# Altium footprint library UWRT Footprint Library.PcbLib: 258 footprints (part 12 of 17)
Each footprint in its own frame and in the unit in brackets; x right, y up, seen from the top. Pads: shape width x height; smd on the part's side, far side on the other; paste and mask are expansions set on the pad; w line width, h text height; cw(c..) or ccw(c..) is an arc to the next point about the centre after c.
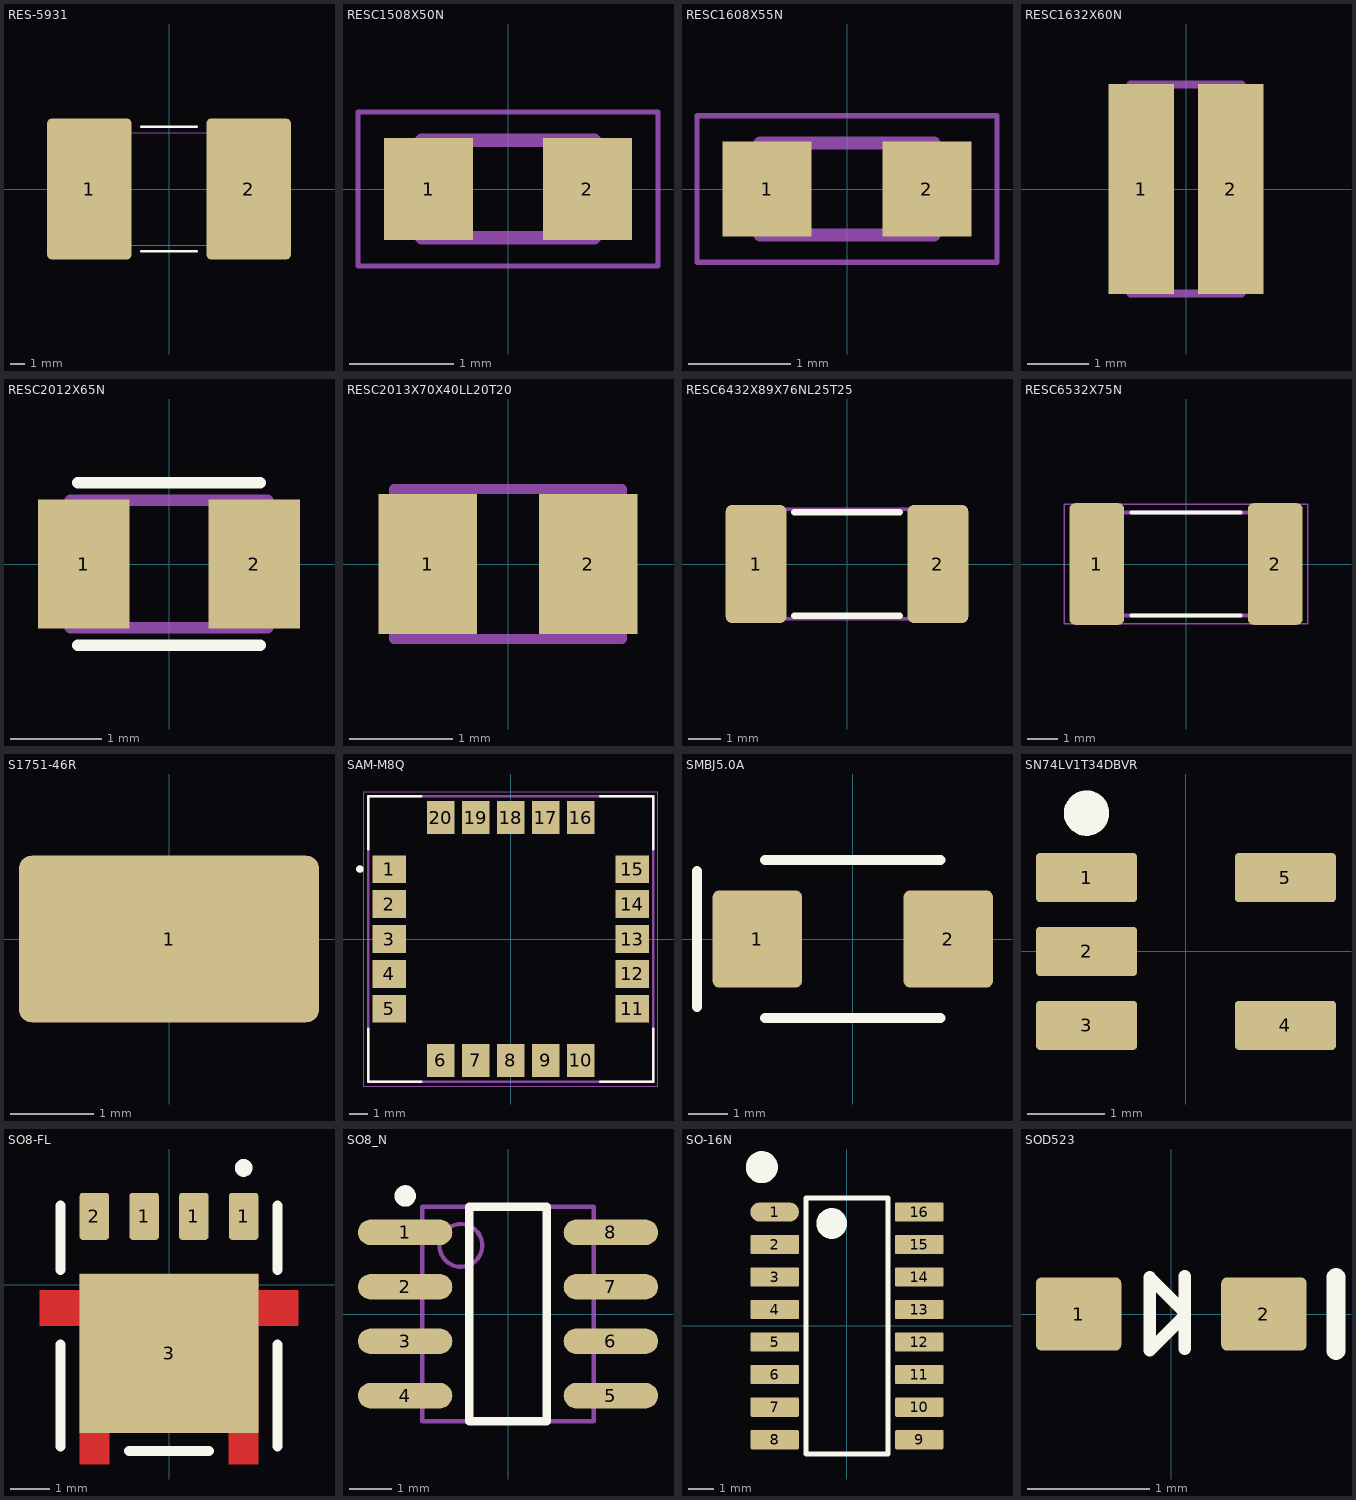
[diagram p11: the footprints below, top view; thin cyan lines are the x and y axes]

## RES-5931 [mm]
pads (2):
  rrect10% 6x10 smd paste+0 mask+0: 1(-5.664,0) 2(5.664,0)
Top Overlay:
  lines w0.152: -2,-4.427 2,-4.427 ; -2,4.427 2,4.427
Mechanical 13:
  circle w0: c-5.537,0 r0.076
  lines w0.025: -7.633,-4 -7.633,4 ; -7.633,-4 7.633,-4 ; -7.633,-4 -3.391,-4 -3.391,4 -7.633,4 ; -7.633,-4 -7.633,4 ; -7.633,4 7.633,4 ; 7.633,-4 7.633,4 ; 7.633,-4 7.633,4 ; 7.633,-4 3.391,-4 3.391,4 7.633,4
3D body "User Library-WSSL5931.step": height 2.36, standoff 0.01, extent -7.5,-3.875 7.5,3.875

## RESC1508X50N [mm]
pads (2):
  rect 0.86x0.98 smd: 1(-0.765,0) 2(0.765,0)
Mechanical 13:
  lines w0.127: -0.83,-0.47 -0.83,0.47 0.83,0.47 0.83,-0.47 -0.83,-0.47
Mechanical 15:
  lines w0.05: -1.444,-0.74 -1.444,0.74 1.444,0.74 1.444,-0.74 -1.444,-0.74

## RESC1608X55N [mm]
pads (2):
  rect 0.87x0.93 smd: 1(-0.78,0) 2(0.78,0)
Mechanical 13:
  lines w0.127: -0.85,-0.45 0.85,-0.45 0.85,0.45 -0.85,0.45 -0.85,-0.45
Mechanical 15:
  lines w0.05: -1.465,-0.715 1.465,-0.715 1.465,0.715 -1.465,0.715 -1.465,-0.715

## RESC1632X60N [mm]
pads (2):
  rect 1.06x3.42 smd: 1(-0.728,0) 2(0.728,0)
Mechanical 13:
  lines w0.127: -0.9,-1.7 0.9,-1.7 0.9,1.7 -0.9,1.7 -0.9,-1.7
3D body "PRL1632-R016-F-T1.STEP": height 0.6, standoff 0, extent -0.798,-1.619 0.802,1.581

## RESC2012X65N [mm]
pads (2):
  rect 1x1.42 smd: 1(-0.935,0) 2(0.935,0)
Top Overlay:
  lines w0.127: -1,-0.89 1,-0.89 ; -1,0.89 1,0.89
Mechanical 4:
  lines w0.127: -1.08,-0.7 1.08,-0.7 ; -1.08,-0.7 -1.08,0.7 ; -1.08,-0.7 1.08,-0.7 ; -1.08,-0.7 -1.08,0.7 ; -1.08,0.7 1.08,0.7 ; -1.08,0.7 1.08,0.7 ; 1.08,-0.7 1.08,0.7 ; 1.08,-0.7 1.08,0.7
3D body "1-1614959-4--3DModel-STEP-56544.STEP": height 0.6, standoff 0, extent -1,-0.625 1,0.625

## RESC2013X70X40LL20T20 [mm] "Chip Resistor, 2-Leads, Body 2.00x1.25mm, IPC High Density"
height 0.7
pads (2):
  rect 0.95x1.35 smd: 1(-0.775,0) 2(0.775,0)
Mechanical 13:
  lines w0.1: -1.1,-0.725 1.1,-0.725 1.1,0.725 -1.1,0.725 -1.1,-0.725
3D body: height 0.7, standoff 0, extent 0.7,-0.725 1.1,0.725
3D body: height 0.7, standoff 0, extent -1.1,-0.725 -0.7,0.725
3D body: height 0.7, standoff 0, extent -0.7,-0.725 0.7,0.725

## RESC6432X89X76NL25T25 [mm] "Chip Resistor, 2-Leads, Body 6.6x3.43mm, IPC Medium Density"
height 0.89
pads (2):
  rrect20% 1.9x3.7 smd: 1(-2.85,0) 2(2.85,0)
Top Overlay:
  lines w0.2: -1.65,-1.625 1.65,-1.625 ; -1.65,1.625 1.65,1.625
Mechanical 13:
  lines w0.1: -3.3,-1.715 -3.3,1.715 3.3,1.715 3.3,-1.715 -3.3,-1.715
3D body "DIOC6432X09N.step": height 0.89, standoff 0, extent -3.3,-1.715 3.3,1.715

## RESC6532X75N [mm]
pads (2):
  rrect20% 1.8x4 smd: 1(-2.935,0) 2(2.935,0)
Top Overlay:
  lines w0.127: -1.79,-1.7 1.79,-1.7 ; -1.79,1.7 1.79,1.7
Mechanical 4:
  lines w0.127: -3.4,-1.7 -3.4,1.7 ; -3.4,-1.7 3.4,-1.7 ; -3.4,-1.7 -3.4,1.7 ; -3.4,-1.7 3.4,-1.7 ; -3.4,1.7 3.4,1.7 ; -3.4,1.7 3.4,1.7 ; 3.4,-1.7 3.4,1.7 ; 3.4,-1.7 3.4,1.7
Mechanical 16:
  lines w0.05: -4.005,-1.958 -4.005,1.958 4.005,1.958 4.005,-1.958 -4.005,-1.958
3D body "2512 Model.STEP": height 0.65, standoff 0, extent -3.175,-1.6 3.175,1.6

## S1751-46R [mm] "SMD LOOP TESTPOINT"
height 2
pads (1):
  rrect15% 3.6x2 smd: 1(0,0)
3D body "s1751-46r.stp": height 2.01, standoff -0.04, extent -1.625,-0.85 1.625,0.8

## SAM-M8Q [mm]
pads (20):
  rect 1.8x1.5 smd paste-2: 1(-6.6,3.8) 2(-6.6,1.9) 3(-6.6,0) 4(-6.6,-1.9) 5(-6.6,-3.8) 11(6.6,-3.8) 12(6.6,-1.9) 13(6.6,0) 14(6.6,1.9) 15(6.6,3.8)
  rect 1.5x1.8 smd paste-2: 6(-3.8,-6.6) 7(-1.9,-6.6) 8(0,-6.6) 9(1.9,-6.6) 10(3.8,-6.6) 16(3.8,6.6) 17(1.9,6.6) 18(0,6.6) 19(-1.9,6.6) 20(-3.8,6.6)
Top Overlay:
  circle w0.2: c-8.2,3.8 r0.1
  lines w0.127: -7.75,-4.87 -7.75,-7.75 -4.87,-7.75 ; -7.75,4.87 -7.75,7.75 -4.87,7.75 ; 4.87,-7.75 7.75,-7.75 7.75,-4.87 ; 4.87,7.75 7.75,7.75 7.75,4.87
Top Paste:
  drawing of 80 lines, arcs and shapes, not listed
Mechanical 13:
  circle w0.2: c-8.2,3.8 r0.1
  lines w0.127: -7.75,-7.75 7.75,-7.75 7.75,7.75 -7.75,7.75 -7.75,-7.75
Mechanical 15:
  lines w0.05: -8,-8 -8,8 8,8 8,-8 -8,-8
3D body "SAM_AP214.STEP": height 6.38, standoff 0, extent -7.738,-7.723 7.763,7.778

## SMBJ5.0A [mm] "9.2V Clamp 65.3A Ipp Tvs Diode Surface Mount SMB (DO-214AA)"
height 2.62
pads (2):
  rrect15% 2.3x2.5 smd: 1(-2.45,0) 2(2.45,0)
Top Overlay:
  lines w0.254: -4,-1.75 -4,1.75 ; -2.25,-2.032 2.25,-2.032 ; -2.25,2.032 2.25,2.032
3D body "User Library-DO-214AA SMB.STEP": height 2.27, standoff -0.03, extent -2.7,-1.8 2.7,1.8

## SN74LV1T34DBVR [mm] "SOT-23-5, Unidirectional level shifter"
height 1.45
pads (5):
  rrect15% 1.3x0.63 smd mask+0.05: 1(-1.279,0.95) 2(-1.279,0) 3(-1.279,-0.95) 4(1.279,-0.95) 5(1.279,0.95)
Top Overlay:
  circle w0.3: c-1.279,1.778 r0.141
3D body "SN74AHC1G02DBVT.stp": height 1.2, standoff 0, extent -1.4,-1.45 1.4,1.45

## SO8-FL [mm]
pads (5):
  rrect20% 0.75x1.2 smd: 1(-0.635,1.75) 1(0.635,1.75) 1(1.905,1.75) 2(-1.905,1.75)
  rect 4.56x4.055 smd mask+0: 3(0,-1.75)
Top Layer:
  region: -2.28,0.285 -2.28,-0.14 -3.302,-0.14 -3.302,-1.045 -2.28,-1.045 -2.28,-4.572 -1.53,-4.572 -1.53,-3.77 1.53,-3.77 1.53,-4.572 2.28,-4.572 2.28,-1.045 3.302,-1.045 3.302,-0.14 2.28,-0.14 2.28,0.285
  region: 1.3,-4.415
Top Overlay:
  circle w0.254: c1.905,2.985 r0.1
  lines w0.254: -2.775,-4.12 -2.775,-1.524 ; -2.775,0.381 -2.775,2.03 ; -1.016,-4.245 1.016,-4.245 ; 2.775,-4.12 2.775,-1.524 ; 2.775,0.381 2.775,2.03
3D body "User Library-DFN5x6_SO8FL.STEP": height 1.13, standoff 0, extent -2.527,-4.12 2.622,2.03

## SO8_N [mm] "SOIC, 8-Leads, Body 4.9x3.9mm, Pitch 1.27mm, IPC Medium Density"
height 1.75
pads (8):
  oval 2.2x0.6 smd: 1(-2.4,1.905) 2(-2.4,0.635) 3(-2.4,-0.635) 4(-2.4,-1.905) 5(2.4,-1.905) 6(2.4,-0.635) 7(2.4,0.635) 8(2.4,1.905)
Top Overlay:
  circle w0.25: c-2.4,2.755 r0.125
  lines w0.2: -0.9,-2.5 -0.9,2.5 0.9,2.5 0.9,-2.5 -0.9,-2.5
Mechanical 13:
  circle w0.1: c-1.1,1.6 r0.5
  lines w0.1: -2,-2.5 -2,2.5 2,2.5 2,-2.5 -2,-2.5
3D body: height 1.75, standoff 0, extent -2,-2.5 2,2.5

## SO-16N [mm]
pads (16):
  oval 1.9x0.75 smd: 1(-2.825,4.445)
  rrect15% 1.9x0.75 smd: 2(-2.825,3.175) 3(-2.825,1.905) 4(-2.825,0.635) 5(-2.825,-0.635) 6(-2.825,-1.905) 7(-2.825,-3.175) 8(-2.825,-4.445) 9(2.825,-4.445) 10(2.825,-3.175) 11(2.825,-1.905) 12(2.825,-0.635) 13(2.825,0.635) 14(2.825,1.905) 15(2.825,3.175) 16(2.825,4.445)
Top Overlay:
  circle w0.6: c-0.6,4 r0.3
  circle w1: c-3.327,6.198 r0.125
  lines w0.2: -1.6,-5 1.6,-5 1.6,5 -1.6,5 -1.6,-5
3D body "SOIC127P600X175-16M.step": height 1.75, standoff 0, extent -3,-5 3,5

## SOD523 [mm] "ESD5Z3.3T1G"
pads (2):
  rrect15% 0.7x0.6 smd: 1(-0.76,0) 2(0.76,0)
Top Overlay:
  lines w0.102: -0.178,0.302 0.11,0.015 ; -0.176,0.3 -0.176,-0.297 0.111,-0.01 ; 0.111,-0.286 0.111,0.311
  lines w0.152: 1.352,-0.3 1.352,0.3
3D body "User Library-SOD-523F.STEP": height 0.7, standoff 0, extent -0.798,-0.399 0.802,0.399